# Altium footprint library Binh.PcbLib: 863 footprints (part 43 of 54)
Each footprint in its own frame and in the unit in brackets; x right, y up, seen from the top. Pads: shape width x height; smd on the part's side, far side on the other; paste and mask are expansions set on the pad; w line width, h text height; cw(c..) or ccw(c..) is an arc to the next point about the centre after c.
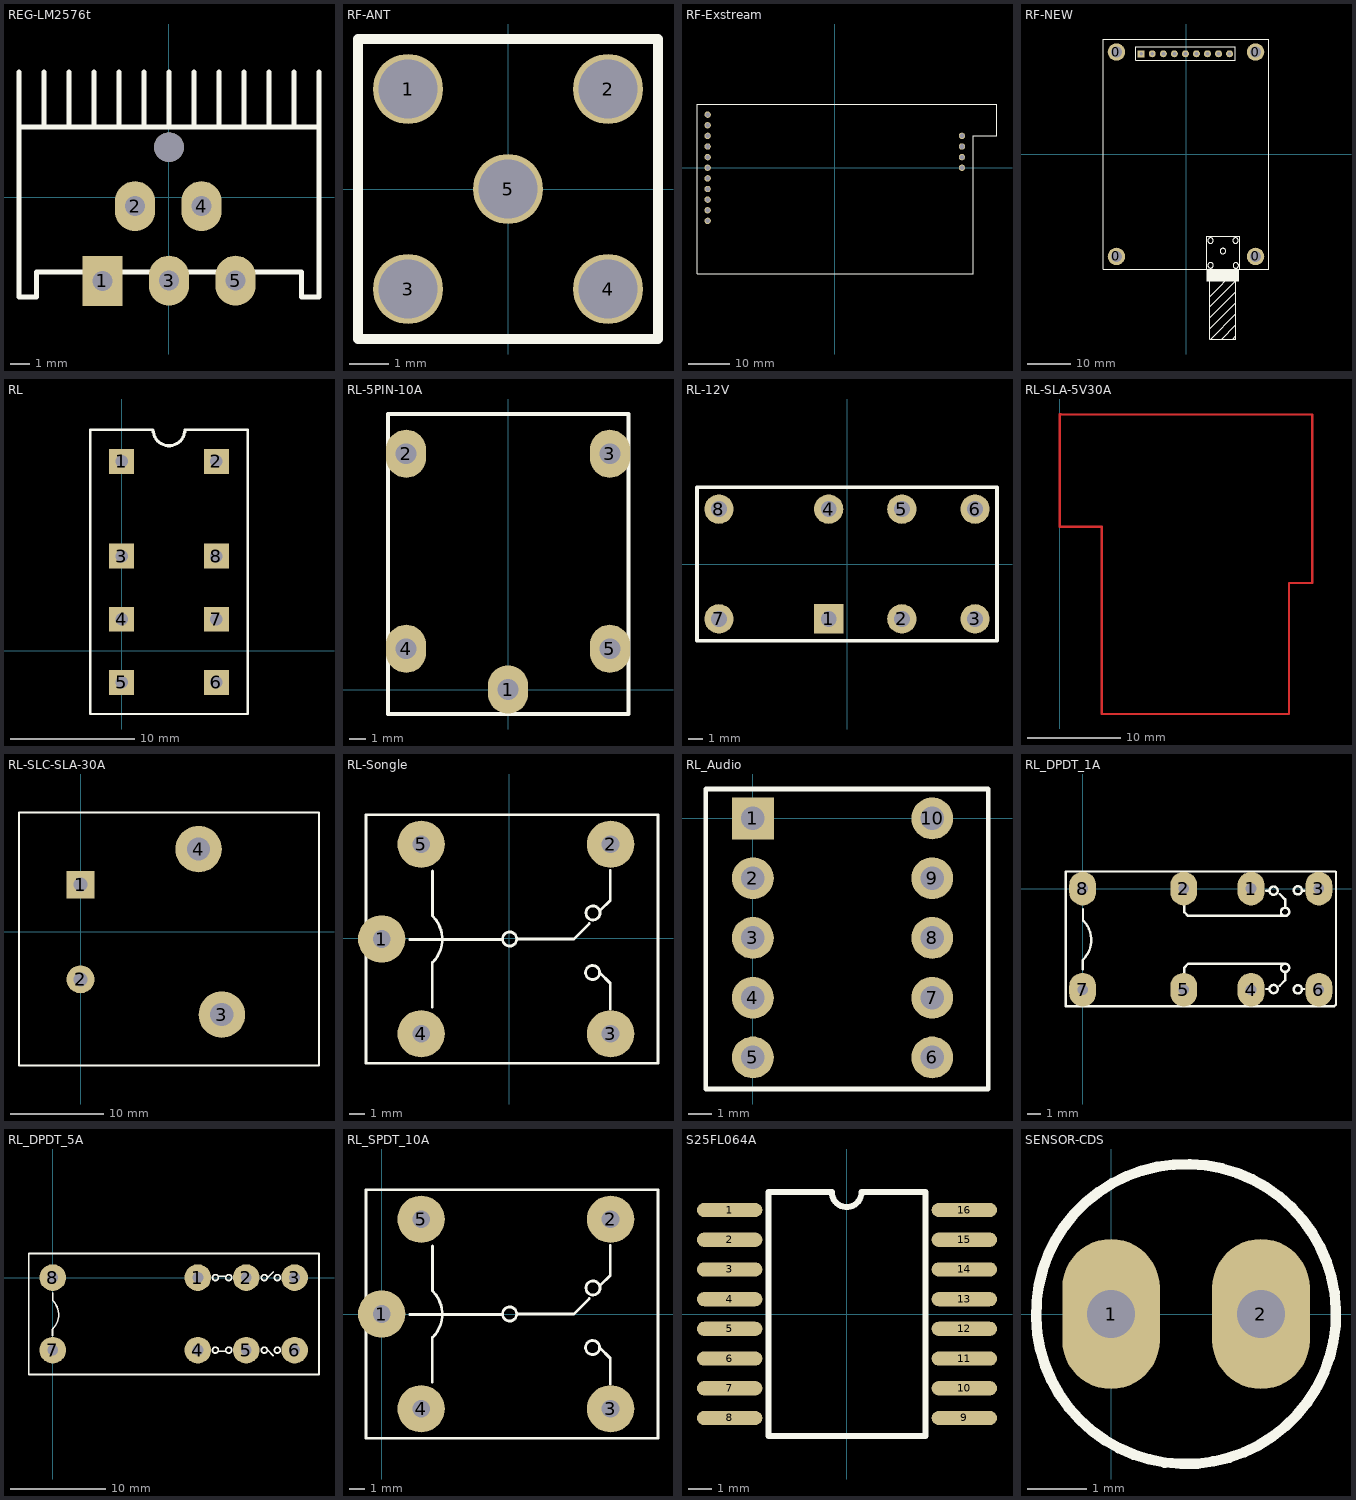
[diagram p42: the footprints below, top view; thin cyan lines are the x and y axes]

## REG-LM2576t [mil]
pads (6):
  rect 80x100 hole 40: 1(-132,-167.09)
  oval 80x100 hole 40: 2(-67,-18) 3(1,-167) 4(66,-18) 5(134,-167)
  round 59.06 hole 59.06: ""(1,100)
Top Overlay:
  lines w10: -299,140 301,140 ; -299,250 -299,-200 -264,-200 -264,-150 266,-150 266,-200 301,-200 301,250 ; -249,140 -249,250 ; -199,140 -199,250 ; -149,140 -149,250 ; -99,140 -99,250 ; -49,140 -49,250 ; 1,140 1,250 ; 51,140 51,250 ; 101,140 101,250 ; 151,140 151,250 ; 201,140 201,250 ; 251,140 251,250
3D body "SW3dPS-TO220-5.STEP": height 859.05, standoff -85.43, extent -199,-174.91 201,149.5

## RF-ANT [mil]
pads (5):
  round 70 hole 59.06 unplated: 1(-100,100) 2(100,100) 3(-100,-100) 4(100,-100) 5(0,0)
Top Overlay:
  lines w10: -150,-150 -150,100 -150,150 150,150 150,-150 -150,-150

## RF-Exstream [mil] "Modul RF maxstream 900MHz"
pads (15):
  round 60 hole 43.31: 1(-1197.5,500) 2(-1197.5,400) 3(-1197.5,300) 4(-1197.5,200) 5(-1197.5,100) 6(-1197.5,0) 7(-1197.5,-100) 8(-1197.5,-200) 9(-1197.5,-300) 10(-1197.5,-400) 11(-1197.5,-500) 12(1197.5,300) 13(1197.5,200) 14(1197.5,100) 15(1197.5,0)
Top Overlay:
  lines w10: -1297.5,-1000 -1297.5,600 1527.5,600 1527.5,300 1302.5,300 1302.5,-1000 -1297.5,-1000

## RF-NEW [mm] "Module RF"
height 10
pads (13):
  round 4 hole 2.5: 0(-16,-23.5) 0(-16,23.5) 0(16,-23.5) 0(16,23.5)
  rect 1.6x1.6 hole 0.9: 1(-10.3,23.1)
  round 1.6 hole 0.9: 2(-7.76,23.1) 3(-5.22,23.1) 4(-2.68,23.1) 5(-0.14,23.1) 6(2.4,23.1) 7(4.94,23.1) 8(7.48,23.1) 9(10.02,23.1)
Top Overlay:
  circle w0.254: c8.497,-22.275 r0.635
  circle w0.254: c5.652,-19.862 r0.635
  circle w0.254: c11.392,-19.862 r0.635
  circle w0.254: c11.455,-25.586 r0.635
  circle w0.254: c5.652,-25.551 r0.635
  rectangle: 4.724,-29.318 12.192,-26.492
  lines w0.2: 5.5,-40.171 11.5,-34.171 ; 5.5,-37.631 11.5,-31.631 ; 5.5,-29.091 8.04,-26.551 ; 5.506,-35.085 11.5,-29.091 ; 5.582,-32.621 11.5,-26.703 ; 5.785,-42.426 11.5,-36.711 ; 8.251,-42.5 11.5,-39.251 ; 10.791,-42.5 11.5,-41.791 ; -11.57,21.59 11.29,21.59 11.29,24.765 -11.57,24.765 -11.57,21.59
  lines w0.254: 5.5,-26.5 5.5,-42.5 11.5,-42.5 11.5,-26.5 ; -19,-26.5 19,-26.5 19,26.5 -19,26.5 -19,-26.5 ; 4.724,-26.5 4.724,-20.15 4.724,-18.88 12.344,-18.88 12.344,-26.5 4.724,-26.5

## RL [mm]
pads (8):
  rect 2x2 hole 1: 1(0,15.24) 2(7.62,15.24) 3(0,7.62) 4(0,2.54) 5(0,-2.54) 6(7.62,-2.54) 7(7.62,2.54) 8(7.62,7.62)
Top Overlay:
  lines w0.2: 2.413,17.78 -2.54,17.78 -2.54,-5.08 10.16,-5.08 10.16,17.78 5.08,17.78
  lines w0.254: 2.534,17.78 ccw(c3.81,17.78) 5.086,17.78
3D body "SW3dPS-DSY2Y.STEP": height 12.3, standoff -3, extent -1.09,-4.05 8.71,16.75

## RL-5PIN-10A [mm]
pads (5):
  oval 2.5x3 hole 1.3: 1(0,0) 2(-6.35,14.7) 3(6.35,14.7) 4(-6.35,2.54) 5(6.35,2.54)
Top Overlay:
  lines w0.254: -7.493,-1.524 7.507,-1.524 7.507,17.176 -7.493,17.176 -7.493,-1.524
3D body: height 16, standoff 0, extent -7.493,-1.524 7.493,17.145

## RL-12V [mil] "RELAY"
pads (8):
  rect 80x80 hole 43.31: 1(-50,-150)
  round 80 hole 43.31: 2(150,-150) 3(350,-150) 4(-50,150) 5(150,150) 6(350,150) 7(-350,-150) 8(-350,150)
Top Overlay:
  lines w10: -410,-210 410,-210 410,210 -410,210 -410,-210

## RL-SLA-5V30A [mil]
Top Layer:
  lines w10: 5,1380 2.05,1380 0,1377.95 ; 0,1377.95 0,1256.38 0,1029.13 0,905.51 177.17,905.51 177.17,118.11 964.57,118.11 964.57,669.29 1062.99,669.29 1062.99,1377.95 0,1377.95

## RL-SLC-SLA-30A [mm] "RELAY"
height 28
pads (4):
  rect 3x3 hole 1.5: 1(0,5.08)
  round 3 hole 1.5: 2(0,-5.1)
  round 5 hole 2.5: 3(15.2,-8.89) 4(12.7,8.91)
Top Overlay:
  lines w0.2: -6.616,-14.359 25.654,-14.359 25.654,12.837 -6.616,12.837 -6.616,-14.359
3D body "RELAY-30A.step": height 20.2, standoff -2.8, extent -6.602,-14.224 25.398,12.776

## RL-Songle [mil]
pads (5):
  round 120 hole 45: 1(-323,-2) 2(257,238) 3(257,-242) 4(-223,-242) 5(-223,238)
Top Overlay:
  circle w7: c211.2,-87 r17.8
  circle w7: c212.2,64 r17.8
  circle w7: c1.2,-2 r17.8
  lines w7: -252,-3 -19,-3 ; -195,-175 -195,-62 ; -194,-61 ccw(c-251.5,-2.5) -193,55 ; -194,56 -194,170 ; 21,-2 164,-2 203,37 ; 229,-87 256,-114 256,-180 ; 230,70 256,96 256,172 ; -363,-317 -363,313 377,313 377,-317 -363,-317
3D body "SONGLE Relay SRU-12VDC-SL-C.STEP": height 610.24, standoff -188.98, extent -355,-310.12 396.97,300.12

## RL_Audio [mil]
pads (10):
  rect 70x70 hole 39.37 unplated: 1(0,0)
  round 70 hole 39.37 unplated: 2(0,-100) 3(0,-200) 4(0,-300) 5(0,-400) 6(300,-400) 7(300,-300) 8(300,-200) 9(300,-100) 10(300,0)
Top Overlay:
  lines w7.87: -78.74,47.24 -78.74,-452.76 393.7,-452.76 393.7,47.24 ; -78.74,49.21 393.7,49.21

## RL_DPDT_1A [mil] "Reley DPDT, 8 pin, 1A, W400mil, L800mil,H 300mil"
height 300
pads (8):
  oval 80x100 hole 32: 1(500,0) 2(300,0) 3(701,0) 4(500,-300) 5(300,-300) 6(701,-300) 7(0,-300) 8(0,0)
Top Overlay:
  circle w7: c638.76,-5 r12.24
  circle w7: c566.76,-6 r12.24
  circle w7: c600.76,-69 r12.24
  circle w7: c600.76,-235 r12.24
  circle w7: c566.76,-298 r12.24
  circle w7: c638.76,-299 r12.24
  lines w7: 0,-239 0,-212 ; 1,-211 ccw(c-56.5,-152.5) 2,-95 ; 1,-94 1,-61 ; 302,-255 302,-234 313,-223 599,-223 ; 302,-42 302,-70 313,-81 599,-81 ; 544,-298 552,-298 ; 544,-6 552,-6 ; 585,-288 601,-272 601,-249 ; 585,-16 601,-32 601,-55 ; 653,-298 658,-298 ; 653,-6 658,-6 ; -50,-349 747,-349 752,-344 752,49 750,51 -50,51 -50,-349
3D body "SW3dPS-DSY2Y.STEP": height 484.25, standoff -118.11, extent -59.45,-340 759.45,45.83

## RL_DPDT_5A [mil] "Reley DPDT, 8 pin, 5A, W500mil, L1100mil,H 950mil"
height 300
pads (8):
  round 110 hole 45: 1(600,0) 2(800,0) 3(1000,0) 4(600,-300) 5(800,-300) 6(1000,-300) 7(0,-300) 8(0,0)
Top Overlay:
  circle w7: c928.76,0 r12.24
  circle w7: c874.76,0 r12.24
  circle w7: c727.76,0 r12.24
  circle w7: c672.76,0 r12.24
  circle w7: c672.76,-300 r12.24
  circle w7: c727.76,-300 r12.24
  circle w7: c874.76,-300 r12.24
  circle w7: c928.76,-300 r12.24
  lines w7: -1,-240 -1,-213 ; 0,-212 ccw(c-57.5,-153.5) 1,-96 ; 0,-95 0,-62 ; 687,-305 716,-305 ; 687,5 716,5 ; 888,-299 912,-323 ; 888,-1 912,23 ; -99,-401 -99,100 1101,100 1101,-401 -99,-401
3D body "Relay DPDT 5A.stp": height 1011.81, standoff -149.61, extent -75.87,-415.75 1065.87,115.74

## RL_SPDT_10A [mil] "Relay SPDT, 5 pin, 10A,W 650mil, L 800mil, H 800mil"
height 800
pads (5):
  round 120 hole 45: 1(0,0) 2(580,240) 3(580,-240) 4(100,-240) 5(100,240)
Top Overlay:
  circle w7: c534.2,-85 r17.8
  circle w7: c535.2,66 r17.8
  circle w7: c324.2,0 r17.8
  lines w7: 71,-1 304,-1 ; 128,-173 128,-60 ; 129,-59 ccw(c71.5,-0.5) 130,57 ; 129,58 129,172 ; 344,0 487,0 526,39 ; 552,-85 579,-112 579,-178 ; 553,72 579,98 579,174 ; -40,-315 -40,315 700,315 700,-315 -40,-315
3D body "SONGLE Relay SRU-12VDC-SL-C.STEP": height 614.17, standoff -185.04, extent -40.99,-310.24 710.98,300

## S25FL064A [mil]
pads (16):
  oval 110x24 smd: 1(-197.5,175) 2(-197.5,125) 3(-197.5,75) 4(-197.5,25) 5(-197.5,-25) 6(-197.5,-75) 7(-197.5,-125) 8(-197.5,-175) 9(197.5,-175) 10(197.5,-125) 11(197.5,-75) 12(197.5,-25) 13(197.5,25) 14(197.5,75) 15(197.5,125) 16(197.5,175)
Top Overlay:
  lines w10: -132.5,-205 -132.5,205 -25.5,205 ccw(c-0.5,205) 24.5,205 132.5,205 132.5,-205 -132.5,-205

## SENSOR-CDS [mil] "QUANG TRO"
height 300
pads (2):
  oval 65x100 hole 32: 1(0,0) 2(100,0)
Top Overlay:
  lines w7: 136.62,-49.97 cw(c50,0) 137.42,-48.56